# Altium footprint library Connector.PcbLib: 536 footprints (part 25 of 34)
Each footprint in its own frame and in the unit in brackets; x right, y up, seen from the top. Pads: shape width x height; smd on the part's side, far side on the other; paste and mask are expansions set on the pad; w line width, h text height; cw(c..) or ccw(c..) is an arc to the next point about the centre after c.
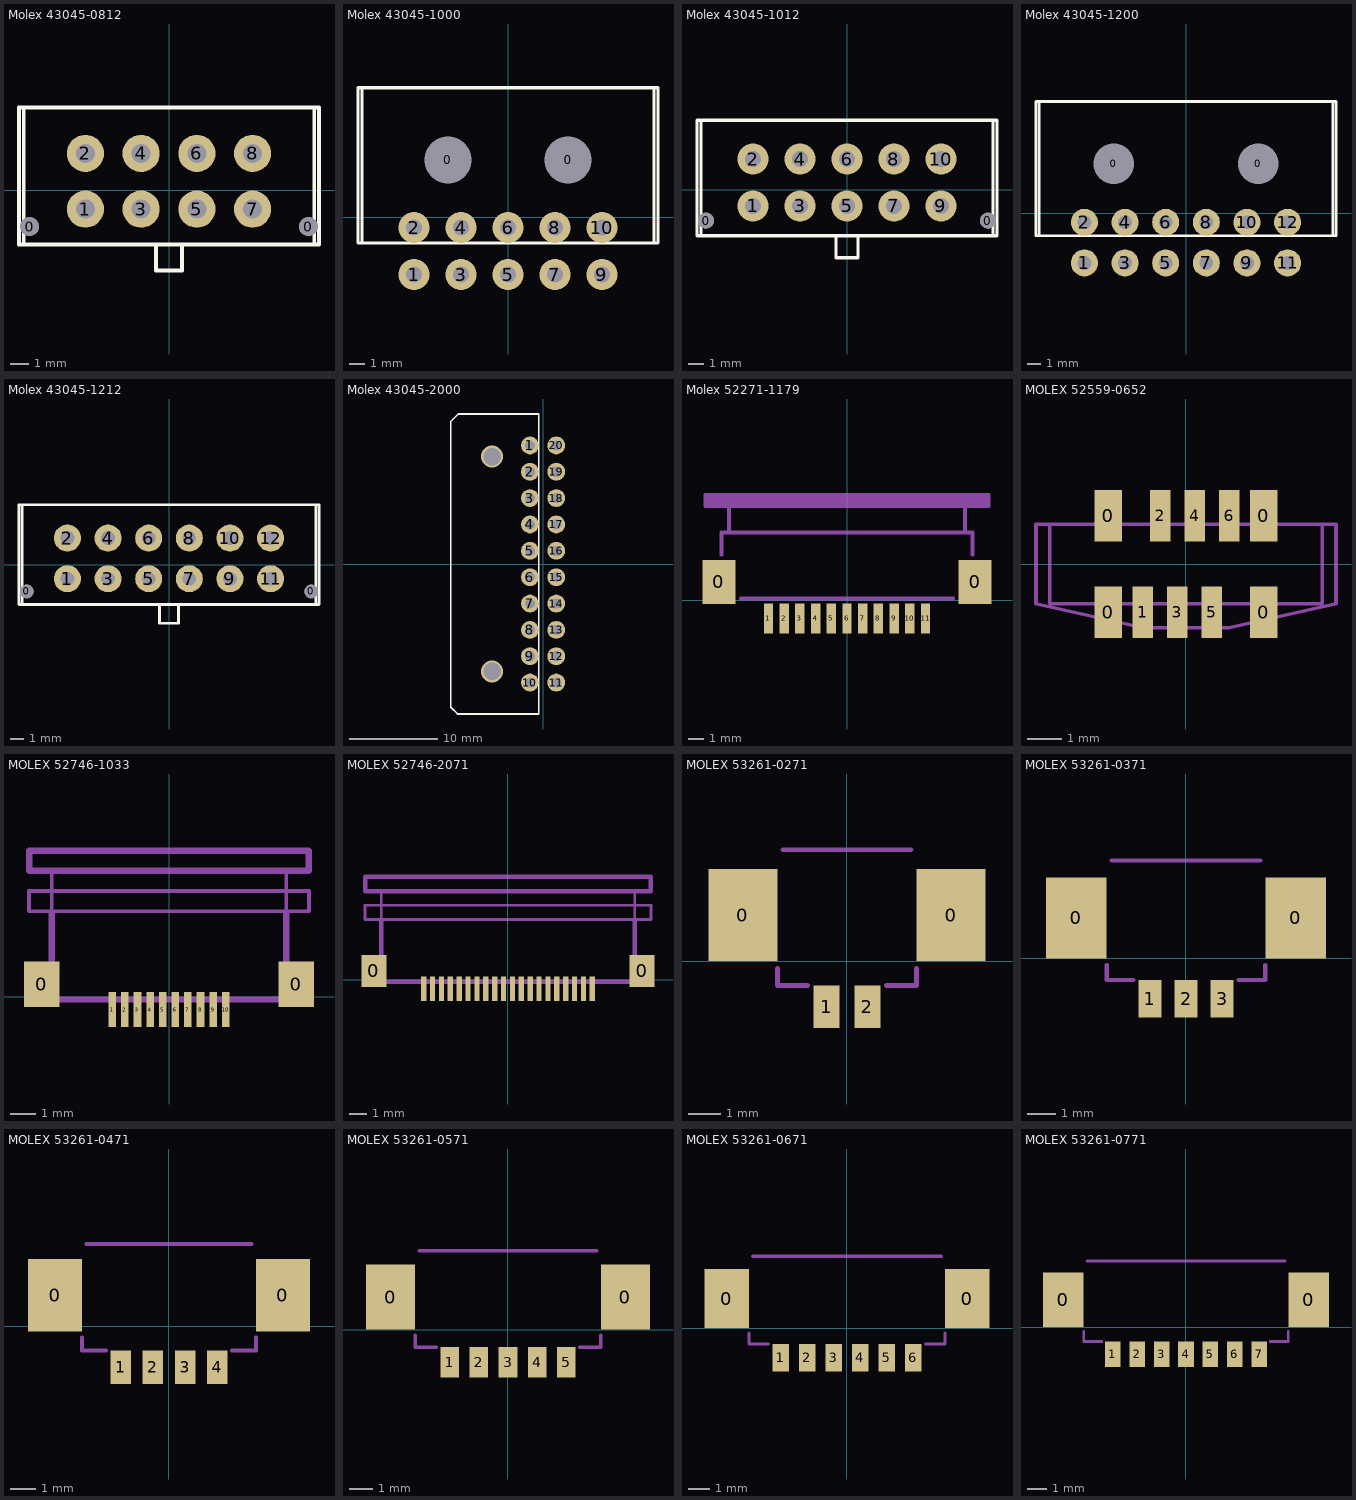
[diagram p24: the footprints below, top view; thin cyan lines are the x and y axes]

## Molex 43045-0812 [mm]
pads (10):
  round 1 hole 1.02: 0(-7.5,-1.97) 0(7.5,-1.97)
  round 2 hole 1.02: 1(-4.5,-1.03) 2(-4.5,1.97) 3(-1.5,-1.03) 4(-1.5,1.97) 5(1.5,-1.03) 6(1.5,1.97) 7(4.5,-1.03) 8(4.5,1.97)
Top Overlay:
  lines w0.2: -7.825,-2.93 -7.825,4.44 ; -0.7,-2.93 -0.7,-4.33 0.7,-4.33 0.7,-2.93 ; 7.825,-2.93 7.825,4.44 ; -8.075,-2.93 -8.075,4.44 8.075,4.44 8.075,-2.93 -8.075,-2.93
3D body "430450812.stp": height 9.95, standoff -3.14, extent -8.075,-4.33 8.075,4.44

## Molex 43045-1000 [mm] "43045-0400"
pads (12):
  round 1 hole 3: 0(-3.84,3.66) 0(3.84,3.66)
  round 2 hole 1.02: 1(-6,-3.66) 2(-6,-0.66) 3(-3,-3.66) 4(-3,-0.66) 5(0,-3.66) 6(0,-0.66) 7(3,-3.66) 8(3,-0.66) 9(6,-3.66) 10(6,-0.66)
Top Overlay:
  lines w0.2: -9.325,-1.65 -9.325,8.26 ; 9.325,-1.65 9.325,8.26 ; -9.575,-1.65 9.575,-1.65 9.575,8.26 -9.575,8.26 -9.575,-1.65
3D body "430451000.stp": height 8.83, standoff -3.12, extent -9.575,-3.98 9.575,8.26

## Molex 43045-1012 [mm]
pads (12):
  round 1 hole 1.02: 0(-9,-1.97) 0(9,-1.97)
  round 2 hole 1.02: 1(-6,-1.03) 2(-6,1.97) 3(-3,-1.03) 4(-3,1.97) 5(0,-1.03) 6(0,1.97) 7(3,-1.03) 8(3,1.97) 9(6,-1.03) 10(6,1.97)
Top Overlay:
  lines w0.2: -9.325,-2.93 -9.325,4.44 ; -0.7,-2.93 -0.7,-4.33 0.7,-4.33 0.7,-2.93 ; 9.325,-2.93 9.325,4.44 ; -9.575,-2.93 9.575,-2.93 9.575,4.44 -9.575,4.44 -9.575,-2.93
3D body "430451012.stp": height 9.95, standoff -3.14, extent -9.575,-4.33 9.575,4.44

## Molex 43045-1200 [mm] "43045-0400"
pads (14):
  round 1 hole 3: 0(-5.34,3.66) 0(5.34,3.66)
  round 2 hole 1.02: 1(-7.5,-3.66) 2(-7.5,-0.66) 3(-4.5,-3.66) 4(-4.5,-0.66) 5(-1.5,-3.66) 6(-1.5,-0.66) 7(1.5,-3.66) 8(1.5,-0.66) 9(4.5,-3.66) 10(4.5,-0.66) 11(7.5,-3.66) 12(7.5,-0.66)
Top Overlay:
  lines w0.2: -10.825,-1.65 -10.825,8.26 ; 10.825,-1.65 10.825,8.26 ; -11.075,-1.65 11.075,-1.65 11.075,8.26 -11.075,8.26 -11.075,-1.65
3D body "430451200.stp": height 8.83, standoff -3.12, extent -11.075,-3.98 11.075,8.26

## Molex 43045-1212 [mm]
pads (14):
  round 1 hole 1.02: 0(-10.5,-1.97) 0(10.5,-1.97)
  round 2 hole 1.02: 1(-7.5,-1.03) 2(-7.5,1.97) 3(-4.5,-1.03) 4(-4.5,1.97) 5(-1.5,-1.03) 6(-1.5,1.97) 7(1.5,-1.03) 8(1.5,1.97) 9(4.5,-1.03) 10(4.5,1.97) 11(7.5,-1.03) 12(7.5,1.97)
Top Overlay:
  lines w0.2: -10.825,-2.93 -10.825,4.44 ; -0.7,-2.93 -0.7,-4.33 0.7,-4.33 0.7,-2.93 ; 10.825,-2.93 10.825,4.44 ; -11.075,-2.93 -11.075,4.44 11.075,4.44 11.075,-2.93 -11.075,-2.93
3D body "430451212.stp": height 9.95, standoff -3.14, extent -11.075,-4.33 11.075,4.44

## Molex 43045-2000 [mil] "2P小5557接线端子"
pads (20):
  round 80 hole 45: 1(-59.06,531.5) 2(-59.06,413.39) 3(-59.06,295.28) 4(-59.06,177.17) 5(-59.06,59.06) 6(-59.06,-59.05) 7(-59.06,-177.17) 8(-59.06,-295.28) 9(-59.06,-413.39) 10(-59.06,-531.5) 11(59.06,-531.5) 12(59.06,-413.39) 13(59.06,-295.28) 14(59.06,-177.17) 15(59.06,-59.05) 16(59.06,59.06) 17(59.06,177.17) 18(59.06,295.28) 19(59.06,413.39) 20(59.06,531.5)
via -228.35,481.3 diameter 98.43 hole 78.74
via -228.35,-481.3 diameter 98.43 hole 78.74
Top Overlay:
  lines w8: -19.68,-672.24 -383.09,-672.24 -413.39,-641.94 -413.39,638.78 -379.92,672.24 -19.68,672.24 -19.68,-670.28
3D body "mini5557_10P.STEP": height 83.27, standoff -387.2, extent -410.95,-673.5 70.94,80.44
3D body "mini5557_10P.STEP": height 83.27, standoff -387.2, extent -410.94,-82.69 70.95,671.25

## Molex 52271-1179 [mm]
pads (13):
  rect 2.1x2.8 smd: 0(-8.15,1.163) 0(8.15,1.163)
  rect 0.6x1.9 smd: 1(-5,-1.162) 2(-4,-1.162) 3(-3,-1.162) 4(-2,-1.162) 5(-1,-1.162) 6(0,-1.162) 7(1,-1.162) 8(2,-1.162) 9(3,-1.162) 10(4,-1.162) 11(5,-1.162)
Mechanical 15:
  lines w0.254: -9.001,6.144 -9.001,5.977 9,5.977 8.999,6.144 ; -9,6.317 -9,6.149 9,6.149 9,6.317 ; -9,6.489 -9,6.321 9,6.321 9,6.489 ; -9,6.706 9,6.706 ; -8,2.902 -8,4.308 8.001,4.308 ; -7.5,4.308 -7.5,5.838 ; -6.75,0.108 6.75,0.108 ; 7.5,4.308 7.5,5.838 ; 8,2.902 8,4.308 ; 9,6.493 9,6.661 ; 9,6.493 -9,6.493 -9,6.665 9,6.665
3D body "522711179.stp": height 3, standoff 0, extent -9,-1.867 9,6.833

## MOLEX 52559-0652 [mm]
pads (10):
  rect 0.8x1.5 smd: 0(-2.25,-1.4) 0(-2.25,1.4) 0(2.25,-1.4) 0(2.25,1.4)
  rect 0.6x1.5 smd: 1(-1.25,-1.4) 2(-0.75,1.4) 3(-0.25,-1.4) 4(0.25,1.4) 5(0.75,-1.4) 6(1.25,1.4)
Mechanical 15:
  lines w0.102: -4.35,-1.15 -4.35,1.15 4.35,1.15 4.35,-1.15 1.25,-1.85 -1.25,-1.85 -4.35,-1.15 ; -3.95,-1.15 3.95,-1.15 3.95,1.15 -3.95,1.15 -3.95,-1.15
3D body "525590652.stp": height 5.3, standoff 0, extent -4.35,-1.85 4.35,1.65

## MOLEX 52746-1033 [mm]
pads (12):
  rect 1.4x1.8 smd: 0(-5.05,0.5) 0(5.05,0.5)
  rect 0.3x1.4 smd: 1(-2.25,-0.5) 2(-1.75,-0.5) 3(-1.25,-0.5) 4(-0.75,-0.5) 5(-0.25,-0.5) 6(0.25,-0.5) 7(0.75,-0.5) 8(1.25,-0.5) 9(1.75,-0.5) 10(2.25,-0.5)
Mechanical 15:
  lines w0.152: -4.648,3.4 -4.648,5 ; 4.648,3.4 4.648,5 ; -5.55,3.4 5.55,3.4 5.55,4.2 -5.55,4.2 -5.55,3.4
  lines w0.254: -4.65,3.327 -4.65,-0.1 4.65,-0.1 4.65,3.327 4.648,3.329 ; -5.55,5 -5.55,5.8 5.55,5.8 5.55,5 -5.55,5
3D body "527461071.stp": height 1.9, standoff -0.1, extent -5.35,-0.8 5.35,5.8

## MOLEX 52746-2071 [mm]
pads (22):
  rect 1.4x1.8 smd: 0(-7.55,0.5) 0(7.55,0.5)
  rect 0.3x1.4 smd: 1(-4.75,-0.5) 2(-4.25,-0.5) 3(-3.75,-0.5) 4(-3.25,-0.5) 5(-2.75,-0.5) 6(-2.25,-0.5) 7(-1.75,-0.5) 8(-1.25,-0.5) 9(-0.75,-0.5) 10(-0.25,-0.5) 11(0.25,-0.5) 12(0.75,-0.5) 13(1.25,-0.5) 14(1.75,-0.5) 15(2.25,-0.5) 16(2.75,-0.5) 17(3.25,-0.5) 18(3.75,-0.5) 19(4.25,-0.5) 20(4.75,-0.5)
Mechanical 15:
  lines w0.152: -7.148,3.4 -7.148,5 ; 7.148,3.4 7.148,5 ; -8.05,3.4 -8.05,4.2 8.05,4.2 8.05,3.4 -8.05,3.4
  lines w0.254: -7.15,3.327 -7.15,-0.1 7.15,-0.1 7.15,3.327 ; -8.05,5 8.05,5 8.05,5.8 -8.05,5.8 -8.05,5
3D body "527462071.stp": height 1.9, standoff -0.1, extent -7.85,-0.8 7.85,5.8

## MOLEX 53261-0271 [mm]
pads (4):
  rect 2.1x2.8 smd: 0(-3.175,1.4) 0(3.175,1.4)
  rect 0.8x1.3 smd: 1(-0.625,-1.4) 2(0.625,-1.4)
Mechanical 15:
  lines w0.15: -2.124,-0.232 -2.124,-0.75 -1.2,-0.75 ; -1.95,3.394 1.95,3.394 ; 1.2,-0.75 2.124,-0.75 2.124,-0.232
3D body "532610271.stp": height 3.43, standoff 0.03, extent -3.825,-1.731 3.825,3.469

## MOLEX 53261-0371 [mm]
pads (5):
  rect 2.1x2.8 smd: 0(-3.8,1.4) 0(3.8,1.4)
  rect 0.8x1.3 smd: 1(-1.25,-1.4) 2(0,-1.4) 3(1.25,-1.4)
Mechanical 15:
  lines w0.15: -2.749,-0.232 -2.749,-0.75 -1.825,-0.75 ; -2.575,3.394 2.575,3.394 ; 1.825,-0.75 2.749,-0.75 2.749,-0.232
3D body "532610371.stp": height 3.43, standoff 0.03, extent -4.45,-1.731 4.45,3.469

## MOLEX 53261-0471 [mm]
height 1.35
pads (6):
  rect 2.1x2.8 smd: 0(-4.425,1.2) 0(4.425,1.2)
  rect 0.8x1.3 smd: 1(-1.875,-1.6) 2(-0.625,-1.6) 3(0.625,-1.6) 4(1.875,-1.6)
Mechanical 15:
  lines w0.15: -3.374,-0.432 -3.374,-0.95 -2.45,-0.95 ; -3.2,3.194 3.2,3.194 ; 2.45,-0.95 3.372,-0.95 3.372,-0.432
3D body "532610471.stp": height 3.43, standoff 0.03, extent -5.075,-1.931 5.075,3.269

## MOLEX 53261-0571 [mm]
pads (7):
  rect 2.1x2.8 smd: 0(-5.05,1.4) 0(5.05,1.4)
  rect 0.8x1.3 smd: 1(-2.5,-1.4) 2(-1.25,-1.4) 3(0,-1.4) 4(1.25,-1.4) 5(2.5,-1.4)
Mechanical 15:
  lines w0.15: -3.999,-0.232 -3.999,-0.75 -3.075,-0.75 ; -3.825,3.394 3.825,3.394 ; 3.075,-0.75 3.999,-0.75 3.999,-0.232
3D body "532610571.stp": height 3.43, standoff 0.03, extent -5.7,-1.731 5.7,3.469

## MOLEX 53261-0671 [mm]
height 1.35
pads (8):
  rect 2.1x2.8 smd: 0(-5.675,1.4) 0(5.675,1.4)
  rect 0.8x1.3 smd: 1(-3.125,-1.4) 2(-1.875,-1.4) 3(-0.625,-1.4) 4(0.625,-1.4) 5(1.875,-1.4) 6(3.125,-1.4)
Mechanical 15:
  lines w0.15: -4.624,-0.232 -4.624,-0.75 -3.7,-0.75 ; -4.45,3.394 4.45,3.394 ; 3.7,-0.75 4.624,-0.75 4.624,-0.232
3D body "User Library-molex 53261-0671.STEP": height 3.5, standoff 0, extent -6.325,-1.731 6.325,3.469

## MOLEX 53261-0771 [mm]
pads (9):
  rect 2.1x2.8 smd: 0(-6.3,1.4) 0(6.3,1.4)
  rect 0.8x1.3 smd: 1(-3.75,-1.4) 2(-2.5,-1.4) 3(-1.25,-1.4) 4(0,-1.4) 5(1.25,-1.4) 6(2.5,-1.4) 7(3.75,-1.4)
Mechanical 15:
  lines w0.15: -5.249,-0.232 -5.249,-0.75 -4.325,-0.75 ; -5.075,3.394 5.075,3.394 ; 4.325,-0.75 5.249,-0.75 5.249,-0.232
3D body "532610771.stp": height 3.43, standoff 0.03, extent -6.95,-1.731 6.95,3.469